# Altium footprint library Connector FPC.PcbLib: 30 footprints (part 1 of 2)
Each footprint in its own frame and in the unit in brackets; x right, y up, seen from the top. Pads: shape width x height; smd on the part's side, far side on the other; paste and mask are expansions set on the pad; w line width, h text height; cw(c..) or ccw(c..) is an arc to the next point about the centre after c.
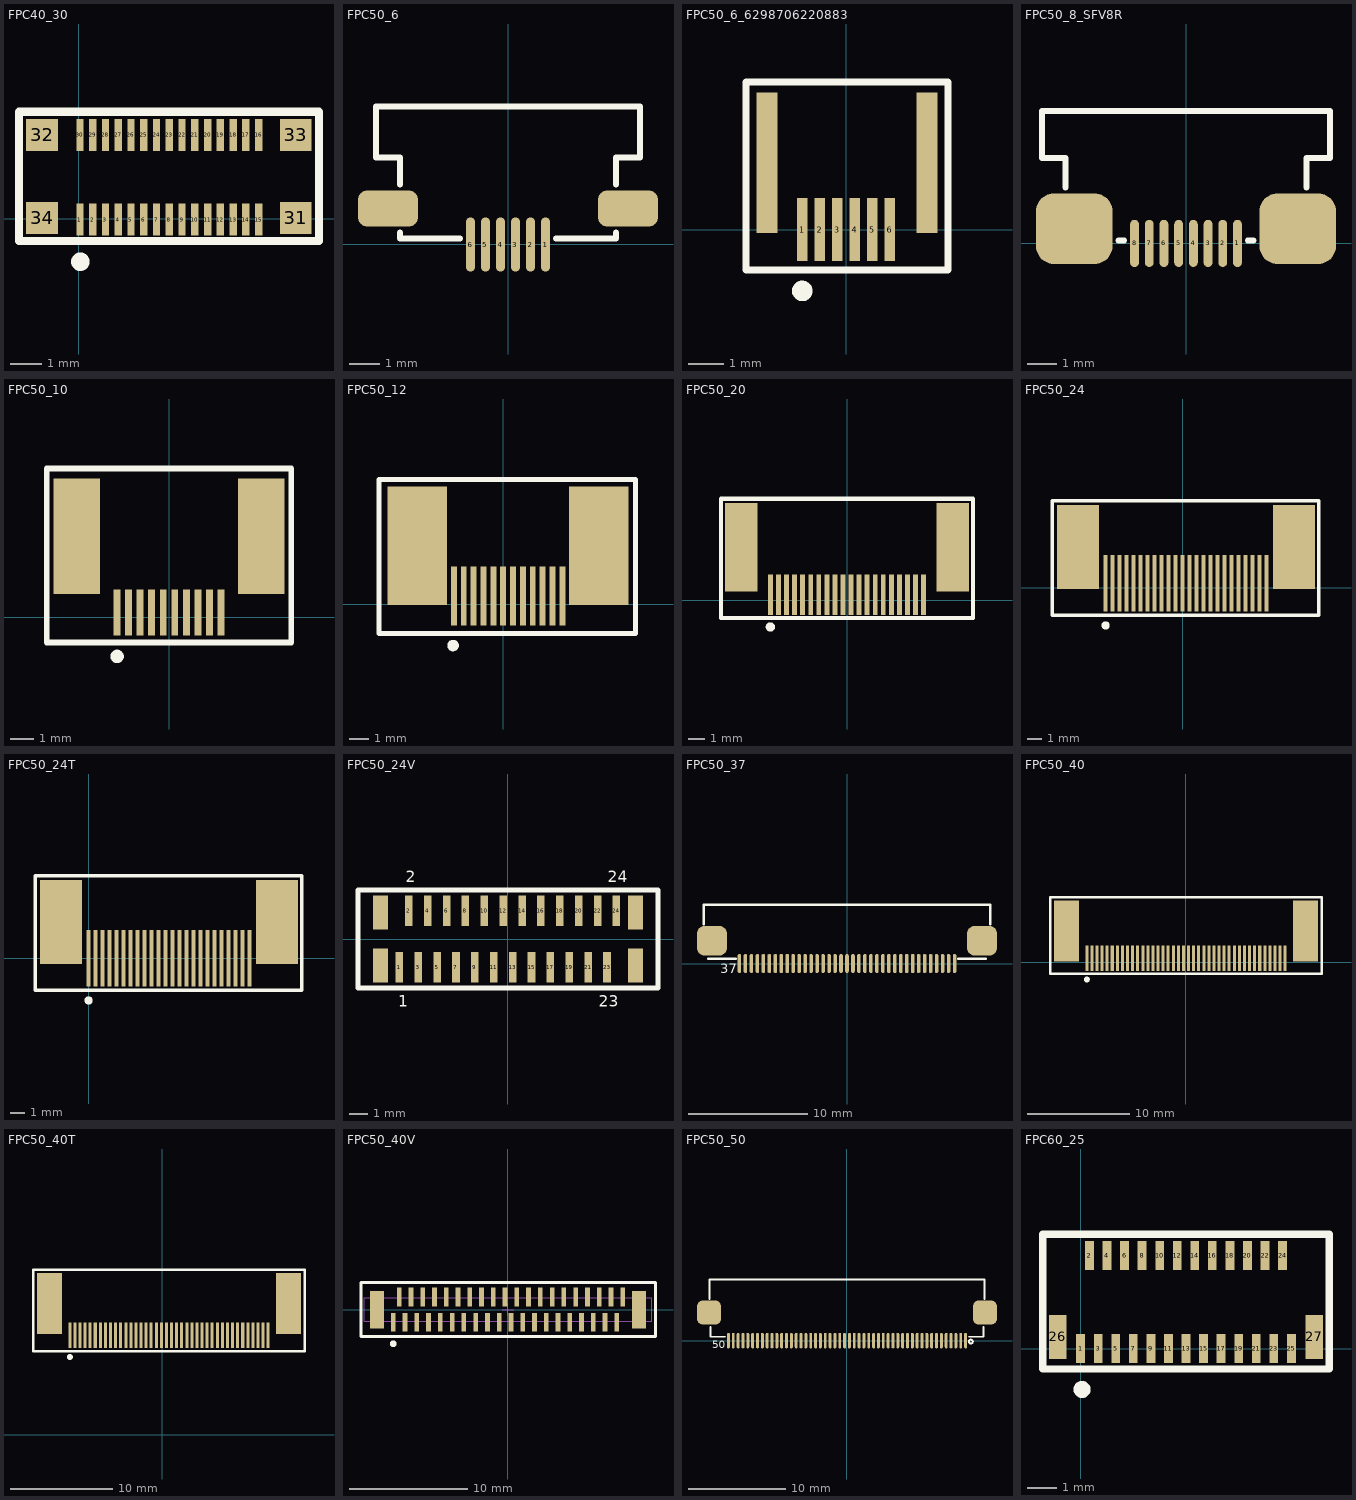
[diagram p0: the footprints below, top view; thin cyan lines are the x and y axes]

## FPC40_30 [mm] "FPC, FH12 Series; 30 Position; 0.4mm, Bottom Contact, AXE530127"
pads (34):
  rect 0.23x1 smd mask+0.05: 1(0.038,-0.027) 2(0.438,-0.027) 3(0.838,-0.027) 4(1.238,-0.027) 5(1.638,-0.027) 6(2.038,-0.027) 7(2.438,-0.027) 8(2.838,-0.027) 9(3.238,-0.027) 10(3.638,-0.027) 11(4.038,-0.027) 12(4.438,-0.027) 13(4.838,-0.027) 14(5.238,-0.027) 15(5.638,-0.027) 16(5.638,2.623) 17(5.238,2.623) 18(4.838,2.623) 19(4.438,2.623) 20(4.038,2.623) 21(3.638,2.623) 22(3.238,2.623) 23(2.838,2.623) 24(2.438,2.623) 25(2.038,2.623) 26(1.638,2.623) 27(1.238,2.623) 28(0.838,2.623) 29(0.438,2.623) 30(0.038,2.623)
  rect 1x1 smd mask+0.05: 31(6.8,0.023) 32(-1.15,2.623) 33(6.8,2.623) 34(-1.15,0.023)
Top Overlay:
  circle w0.3: c0.05,-1.35 r0.141
  lines w0.254: -1.871,-0.7 7.529,-0.7 7.529,3.35 -1.871,3.35 -1.871,-0.7
3D body "47766.stp": height 1.95, standoff 0, extent -1.45,-0.4 7.15,2.98

## FPC50_6 [mm] "FFC-FPC 6pin pitch: 0.5mm FCI SFV6R1STBE1HLF"
height 3
pads (8):
  oval 0.3x1.8 smd mask+0.075: 1(1.25,0) 2(0.75,0) 3(0.25,0) 4(-0.25,0) 5(-0.75,0) 6(-1.25,0)
  rrect50% 2x1.2 smd: ""(-4,1.2) ""(4,1.2)
Top Overlay:
  lines w0.2: -3.6,0.4 -3.6,0.2 -1.6,0.2 ; -3.6,2 -3.6,2.9 -4.4,2.9 -4.4,4.6 4.4,4.6 4.4,2.9 3.6,2.9 3.6,2 ; 1.6,0.2 3.6,0.2 3.6,0.4
3D body "sfv6r1stbe1hlf.stp": height 1.9, standoff 0.03, extent -4.25,-0.4 4.25,4.5

## FPC50_6_6298706220883 [mm] "FFC-FPC 6pin pitch: 0.5mm FCI 6298706220883"
height 3
pads (8):
  rect 0.3x1.8 smd mask+0.075: 1(-1.25,0) 2(-0.75,0) 3(-0.25,0) 4(0.25,0) 5(0.75,0) 6(1.25,0)
  rect 0.6x4 smd: ""(-2.25,1.9) ""(2.3,1.9)
Top Overlay:
  circle w0.3: c-1.25,-1.75 r0.141
  lines w0.2: -2.85,-1.15 2.9,-1.15 2.9,4.2 -2.85,4.2 -2.85,-1.15
3D body "User Library-FPC0_5MM1_2H6P.STEP": height 0.88, standoff -0.02, extent -2.25,-0.2 2.25,3.8

## FPC50_8_SFV8R [mm] "FPC 8pin pitch: 0.5mm FCI SFV8R-2STE1HLF"
pads (10):
  oval 0.3x1.6 smd mask+0.05: 1(1.75,0) 2(1.25,0) 3(0.75,0) 4(0.25,0) 5(-0.25,0) 6(-0.75,0) 7(-1.25,0) 8(-1.75,0)
  rrect50% 2.6x2.4 smd: ""(-3.8,0.5) ""(3.8,0.5)
Top Overlay:
  lines w0.2: -4.1,1.9 -4.1,2.9 -4.9,2.9 -4.9,4.5 4.9,4.5 4.9,2.9 4.1,2.9 4.1,1.9 ; -2.3,0.1 -2.1,0.1 ; 2.1,0.1 2.3,0.1
3D body "ssfv8r_2stlf.stp": height 1.82, standoff -0.05, extent -4.75,-0.5 4.75,4.4

## FPC50_10 [mm] "FPC, 0.50mm, SMT,RA Bot. Contact, WE 687110149022"
height 7.62
pads (12):
  rect 0.3x2 smd mask+0.05: 1(-2.25,0.2) 2(-1.75,0.2) 3(-1.25,0.2) 4(-0.75,0.2) 5(-0.25,0.2) 6(0.25,0.2) 7(0.75,0.2) 8(1.25,0.2) 9(1.75,0.2) 10(2.25,0.2)
  rect 2x5 smd: ""(-4,3.5) ""(4,3.5)
Top Overlay:
  circle w0.3: c-2.25,-1.7 r0.141
  lines w0.254: -5.3,-1.1 -5.3,6.45 5.3,6.45 5.3,-1.1 -5.3,-1.1
3D body "687110149022.stp": height 2.25, standoff 0, extent -4.55,-0.225 4.55,6.275

## FPC50_12 [mm] "FH12-12S-0.5SH FFC-FPC pitch: 0.5mm"
height 3
pads (14):
  rect 0.3x3 smd: 1(-2.51,0.41) 2(-2.01,0.41) 3(-1.51,0.41) 4(-1.01,0.41) 5(-0.51,0.41) 6(-0.01,0.41) 7(0.49,0.41) 8(0.99,0.41) 9(1.49,0.41) 10(1.99,0.41) 11(2.49,0.41) 12(2.99,0.41)
  rect 3x6 smd: ""(-4.37,2.96) ""(4.84,2.96)
Top Overlay:
  circle w0.3: c-2.55,-2.1 r0.141
  lines w0.254: -6.3,-1.5 -6.3,6.31 6.7,6.31 6.7,-1.5 -6.3,-1.5
3D body "16r9529_1-1734592-2.stp": height 2, standoff -0.05, extent -5.465,0.7 5.965,5.81

## FPC50_20 [mm] "FH12-20S-0.5SH FFC-FPC pitch: 0.5mm"
height 3
pads (22):
  rect 0.3x2.5 smd mask+0.05: 1(-4.75,0.35) 2(-4.25,0.35) 3(-3.75,0.35) 4(-3.25,0.35) 5(-2.75,0.35) 6(-2.25,0.35) 7(-1.75,0.35) 8(-1.25,0.35) 9(-0.75,0.35) 10(-0.25,0.35) 11(0.25,0.35) 12(0.75,0.35) 13(1.25,0.35) 14(1.75,0.35) 15(2.25,0.35) 16(2.75,0.35) 17(3.25,0.35) 18(3.75,0.35) 19(4.25,0.35) 20(4.75,0.35)
  rect 2x5.5 smd: ""(-6.55,3.3) ""(6.55,3.3)
Top Overlay:
  circle w0.3: c-4.75,-1.65 r0.141
  lines w0.254: -7.8,-1.1 7.8,-1.1 7.8,6.3 -7.8,6.3 -7.8,-1.1
3D body "FH12-20S-0.5SH.stp": height 2.14, standoff 0.04, extent -7.05,-0.2 7.05,6.2

## FPC50_24 [mm] "FPC, FH12 Series; 24 Position; 0.5mm, Bottom Contact, FH12F-24S-0.5SH"
pads (26):
  rect 0.3x4 smd: 1(-5.51,0.31) 2(-5.01,0.31) 3(-4.51,0.31) 4(-4.01,0.31) 5(-3.51,0.31) 6(-3.01,0.31) 7(-2.51,0.31) 8(-2.01,0.31) 9(-1.51,0.31) 10(-1.01,0.31) 11(-0.51,0.31) 12(-0.01,0.31) 13(0.49,0.31) 14(0.99,0.31) 15(1.49,0.31) 16(1.99,0.31) 17(2.49,0.31) 18(2.99,0.31) 19(3.49,0.31) 20(3.99,0.31) 21(4.49,0.31) 22(4.99,0.31) 23(5.49,0.31) 24(5.99,0.31)
  rect 3x6 smd: ""(-7.47,2.91) ""(7.94,2.91)
Top Overlay:
  circle w0.3: c-5.5,-2.7 r0.141
  lines w0.254: -9.3,-1.97 -9.3,6.21 9.72,6.21 9.72,-1.97 -9.3,-1.97
3D body "5603.stp": height 2, standoff -0.04, extent -9.08,-0.83 9.52,5.97

## FPC50_24T [mm] "Connector; FH12 Series; 24 Position; 0.5mm, Top Contact, FH12A-24S-0.5SH(55)"
height 2
pads (26):
  rect 0.3x4 smd: 1(0,0) 2(0.5,0) 3(1,0) 4(1.5,0) 5(2,0) 6(2.5,0) 7(3,0) 8(3.5,0) 9(4,0) 10(4.5,0) 11(5,0) 12(5.5,0) 13(6,0) 14(6.5,0) 15(7,0) 16(7.5,0) 17(8,0) 18(8.5,0) 19(9,0) 20(9.5,0) 21(10,0) 22(10.5,0) 23(11,0) 24(11.5,0)
  rect 3x6 smd: ""(-1.96,2.6) ""(13.45,2.6)
Top Overlay:
  circle w0.3: c0.01,-3.01 r0.141
  lines w0.254: -3.79,-2.28 15.23,-2.28 15.23,5.9 -3.79,5.9 -3.79,-2.28
3D body "FH12A-24S-0.5SH.stp": height 2.05, standoff -0.1, extent -2.74,-1.46 13.76,5.54

## FPC50_24V [mm] "Connector; FH12 Series; 24 Position; 0.5mm, Vertical, FH12-24S-0.5SV"
height 4.85
pads (28):
  rect 0.4x1.6 smd: 1(-5.75,-1.5) 2(-5.25,1.5) 3(-4.75,-1.5) 4(-4.25,1.5) 5(-3.75,-1.5) 6(-3.25,1.5) 7(-2.75,-1.5) 8(-2.25,1.5) 9(-1.75,-1.5) 10(-1.25,1.5) 11(-0.75,-1.5) 12(-0.25,1.5) 13(0.25,-1.5) 14(0.75,1.5) 15(1.25,-1.5) 16(1.75,1.5) 17(2.25,-1.5) 18(2.75,1.5) 19(3.25,-1.5) 20(3.75,1.5) 21(4.25,-1.5) 22(4.75,1.5) 23(5.25,-1.5) 24(5.75,1.5)
  rect 0.8x1.8 smd: ""(-6.75,-1.4) ""(-6.75,1.4) ""(6.75,-1.4) ""(6.75,1.4)
Top Overlay:
  lines w0.254: -7.94,-2.6 7.95,-2.6 7.95,2.6 -7.94,2.6 -7.94,-2.6
  text "23" at 4.8,-3.6 h0.6
  text "24" at 5.3,3 h0.6
  text "2" at -5.4,3 h0.6
  text "1" at -5.8,-3.6 h0.6
3D body "FH12-24S-0.5SV.stp": height 5.48, standoff -0.03, extent -7.7,-1.8 7.7,2

## FPC50_37 [mm] "FPC, pitch: 0.5mm, TE 3-1734592-7"
height 3
pads (39):
  oval 0.3x1.6 smd mask+0.05: 1(9,0) 2(8.5,0) 3(8,0) 4(7.5,0) 5(7,0) 6(6.5,0) 7(6,0) 8(5.5,0) 9(5,0) 10(4.5,0) 11(4,0) 12(3.5,0) 13(3,0) 14(2.5,0) 15(2,0) 16(1.5,0) 17(1,0) 18(0.5,0) 19(0,0) 20(-0.5,0) 21(-1,0) 22(-1.5,0) 23(-2,0) 24(-2.5,0) 25(-3,0) 26(-3.5,0) 27(-4,0) 28(-4.5,0) 29(-5,0) 30(-5.5,0) 31(-6,0) 32(-6.5,0) 33(-7,0) 34(-7.5,0) 35(-8,0) 36(-8.5,0) 37(-9,0)
  rrect50% 2.5x2.5 smd: ""(-11.3,1.9) ""(11.3,1.9)
Top Overlay:
  lines w0.2: -12,3.3 -12,4.9 12,4.9 12,3.3 ; -11.6,0.4 -9.3,0.4 ; 9.3,0.4 11.6,0.4
  text "37" at -10.6,-0.8 h0.8
3D body "3-1734592-7.stp": height 2.05, standoff 0, extent -11.965,-0.3 11.965,4.81

## FPC50_40 [mm] "FPC, pitch: 0.5mm, FH12-40S-0.5SH, molex 54132-4062"
height 3
pads (42):
  rect 0.3x2.5 smd mask+0.05: 1(-9.75,0.4) 2(-9.25,0.4) 3(-8.75,0.4) 4(-8.25,0.4) 5(-7.75,0.4) 6(-7.25,0.4) 7(-6.75,0.4) 8(-6.25,0.4) 9(-5.75,0.4) 10(-5.25,0.4) 11(-4.75,0.4) 12(-4.25,0.4) 13(-3.75,0.4) 14(-3.25,0.4) 15(-2.75,0.4) 16(-2.25,0.4) 17(-1.75,0.4) 18(-1.25,0.4) 19(-0.75,0.4) 20(-0.25,0.4) 21(0.25,0.4) 22(0.75,0.4) 23(1.25,0.4) 24(1.75,0.4) 25(2.25,0.4) 26(2.75,0.4) 27(3.25,0.4) 28(3.75,0.4) 29(4.25,0.4) 30(4.75,0.4) 31(5.25,0.4) 32(5.75,0.4) 33(6.25,0.4) 34(6.75,0.4) 35(7.25,0.4) 36(7.75,0.4) 37(8.25,0.4) 38(8.75,0.4) 39(9.25,0.4) 40(9.75,0.4)
  rect 2.5x6 smd: ""(-11.75,3.05) ""(11.75,3.05)
Top Overlay:
  circle w0.3: c-9.75,-1.7 r0.141
  lines w0.254: -13.34,-1.15 -13.34,6.4 13.35,6.4 13.35,-1.15 -13.34,-1.15
3D body "FH12-40S-0.5SH.stp": height 2.09, standoff -0.01, extent -12.05,-0.3 12.05,6.1

## FPC50_40T [mm] "FPC, FH12 Series; 40 Position; 0.5mm, Top Contact"
height 2
pads (42):
  rect 0.3x2.5 smd mask+0.05: 1(-9.1,9.8) 2(-8.6,9.8) 3(-8.1,9.8) 4(-7.6,9.8) 5(-7.1,9.8) 6(-6.6,9.8) 7(-6.1,9.8) 8(-5.6,9.8) 9(-5.1,9.8) 10(-4.6,9.8) 11(-4.1,9.8) 12(-3.6,9.8) 13(-3.1,9.8) 14(-2.6,9.8) 15(-2.1,9.8) 16(-1.6,9.8) 17(-1.1,9.8) 18(-0.6,9.8) 19(-0.1,9.8) 20(0.4,9.8) 21(0.9,9.8) 22(1.4,9.8) 23(1.9,9.8) 24(2.4,9.8) 25(2.9,9.8) 26(3.4,9.8) 27(3.9,9.8) 28(4.4,9.8) 29(4.9,9.8) 30(5.4,9.8) 31(5.9,9.8) 32(6.4,9.8) 33(6.9,9.8) 34(7.4,9.8) 35(7.9,9.8) 36(8.4,9.8) 37(8.9,9.8) 38(9.4,9.8) 39(9.9,9.8) 40(10.4,9.8)
  rect 2.5x6 smd: ""(-11.1,12.9) ""(12.4,12.9)
Top Overlay:
  circle w0.3: c-9.1,7.65 r0.141
  lines w0.254: -12.69,8.2 14,8.2 14,16.25 -12.69,16.25 -12.69,8.2
3D body "FH12A-40S-0.5SH.stp": height 2.05, standoff -0.1, extent -11.6,9.15 12.9,16.15

## FPC50_40V [mm] "FPC, FH12 Series; 40 Position; 0.5mm,Vertical, FH12-40S-0.5SVA"
pads (42):
  rect 0.4x1.6 smd mask+0.1: 1(-9.75,-1.075) 2(-9.25,1.075) 3(-8.75,-1.075) 4(-8.25,1.075) 5(-7.75,-1.075) 6(-7.25,1.075) 7(-6.75,-1.075) 8(-6.25,1.075) 9(-5.75,-1.075) 10(-5.25,1.075) 11(-4.75,-1.075) 12(-4.25,1.075) 13(-3.75,-1.075) 14(-3.25,1.075) 15(-2.75,-1.075) 16(-2.25,1.075) 17(-1.75,-1.075) 18(-1.25,1.075) 19(-0.75,-1.075) 20(-0.25,1.075) 21(0.25,-1.075) 22(0.75,1.075) 23(1.25,-1.075) 24(1.75,1.075) 25(2.25,-1.075) 26(2.75,1.075) 27(3.25,-1.075) 28(3.75,1.075) 29(4.25,-1.075) 30(4.75,1.075) 31(5.25,-1.075) 32(5.75,1.075) 33(6.25,-1.075) 34(6.75,1.075) 35(7.25,-1.075) 36(7.75,1.075) 37(8.25,-1.075) 38(8.75,1.075) 39(9.25,-1.075) 40(9.75,1.075)
  rect 1.2x3.2 smd: ""(-11.15,0) ""(11.15,0)
Top Overlay:
  circle w0.3: c-9.75,-2.9 r0.141
  lines w0.254: -12.49,-2.3 -12.49,2.3 12.55,2.3 12.55,-2.3 -12.49,-2.3
Mechanical 13:
  lines w0.1: -12.2,-1 -12.2,1 12.2,1 12.2,-1 -12.2,-1
Mechanical 15:
  lines w0.1: -0.5,0 0.5,0 ; 0,-0.5 0,0.5
3D body "ZIF connector.stp": height 4.47, standoff -0.02, extent -12.118,-1.454 12.182,1.483

## FPC50_50 [mm] "FPC, pitch: 0.5mm, FH12-50S-0.5SH"
height 3
pads (52):
  oval 0.3x1.6 smd mask+0.05: 1(12.25,0) 2(11.75,0) 3(11.25,0) 4(10.75,0) 5(10.25,0) 6(9.75,0) 7(9.25,0) 8(8.75,0) 9(8.25,0) 10(7.75,0) 11(7.25,0) 12(6.75,0) 13(6.25,0) 14(5.75,0) 15(5.25,0) 16(4.75,0) 17(4.25,0) 18(3.75,0) 19(3.25,0) 20(2.75,0) 21(2.25,0) 22(1.75,0) 23(1.25,0) 24(0.75,0) 25(0.25,0) 26(-0.25,0) 27(-0.75,0) 28(-1.25,0) 29(-1.75,0) 30(-2.25,0) 31(-2.75,0) 32(-3.25,0) 33(-3.75,0) 34(-4.25,0) 35(-4.75,0) 36(-5.25,0) 37(-5.75,0) 38(-6.25,0) 39(-6.75,0) 40(-7.25,0) 41(-7.75,0) 42(-8.25,0) 43(-8.75,0) 44(-9.25,0) 45(-9.75,0) 46(-10.25,0) 47(-10.75,0) 48(-11.25,0) 49(-11.75,0) 50(-12.25,0)
  rrect50% 2.5x2.5 smd: ""(-14.25,2.9) ""(14.25,2.9)
Top Overlay:
  circle w0.2: c12.8,-0.1 r0.2
  lines w0.2: -14.2,4.3 -14.2,6.3 14.2,6.3 14.2,4.3 ; -14.1,1.4 -14.1,0.4 -12.6,0.4 ; 12.6,0.4 14.1,0.4 14.1,1.4
  text "50" at -13.9,-0.8 h0.8
3D body "FH12-50S-0.5SH.stp": height 2.09, standoff -0.01, extent -14.55,-0.3 14.55,6.1

## FPC60_25 [mm] "FPC, FH12 Series; 25 Position; 0.6mm, Bottom Contact, FH26W-25S-0.3SHW(60)"
pads (27):
  rect 0.3x1 smd mask+0.05: 1(0,0) 2(0.3,3.175) 3(0.6,0) 4(0.9,3.175) 5(1.2,0) 6(1.5,3.175) 7(1.8,0) 8(2.1,3.175) 9(2.4,0) 10(2.7,3.175) 11(3,0) 12(3.3,3.175) 13(3.6,0) 14(3.9,3.175) 15(4.2,0) 16(4.5,3.175) 17(4.8,0) 18(5.1,3.175) 19(5.4,0) 20(5.7,3.175) 21(6,0) 22(6.3,3.175) 23(6.6,0) 24(6.9,3.175) 25(7.2,0)
  rect 0.6x1.5 smd mask+0.05: 26(-0.775,0.4) 27(7.975,0.4)
Top Overlay:
  circle w0.3: c0.05,-1.4 r0.141
  lines w0.254: -1.3,-0.7 8.5,-0.7 8.5,3.9 -1.3,3.9 -1.3,-0.7
3D body "10061122251120hlf.stp": height 0.9, standoff 0, extent -1.05,-0.2 8.25,3.3